# Altium footprint library FS_Footprints.PcbLib: 134 footprints (part 3 of 9)
Each footprint in its own frame and in the unit in brackets; x right, y up, seen from the top. Pads: shape width x height; smd on the part's side, far side on the other; paste and mask are expansions set on the pad; w line width, h text height; cw(c..) or ccw(c..) is an arc to the next point about the centre after c.
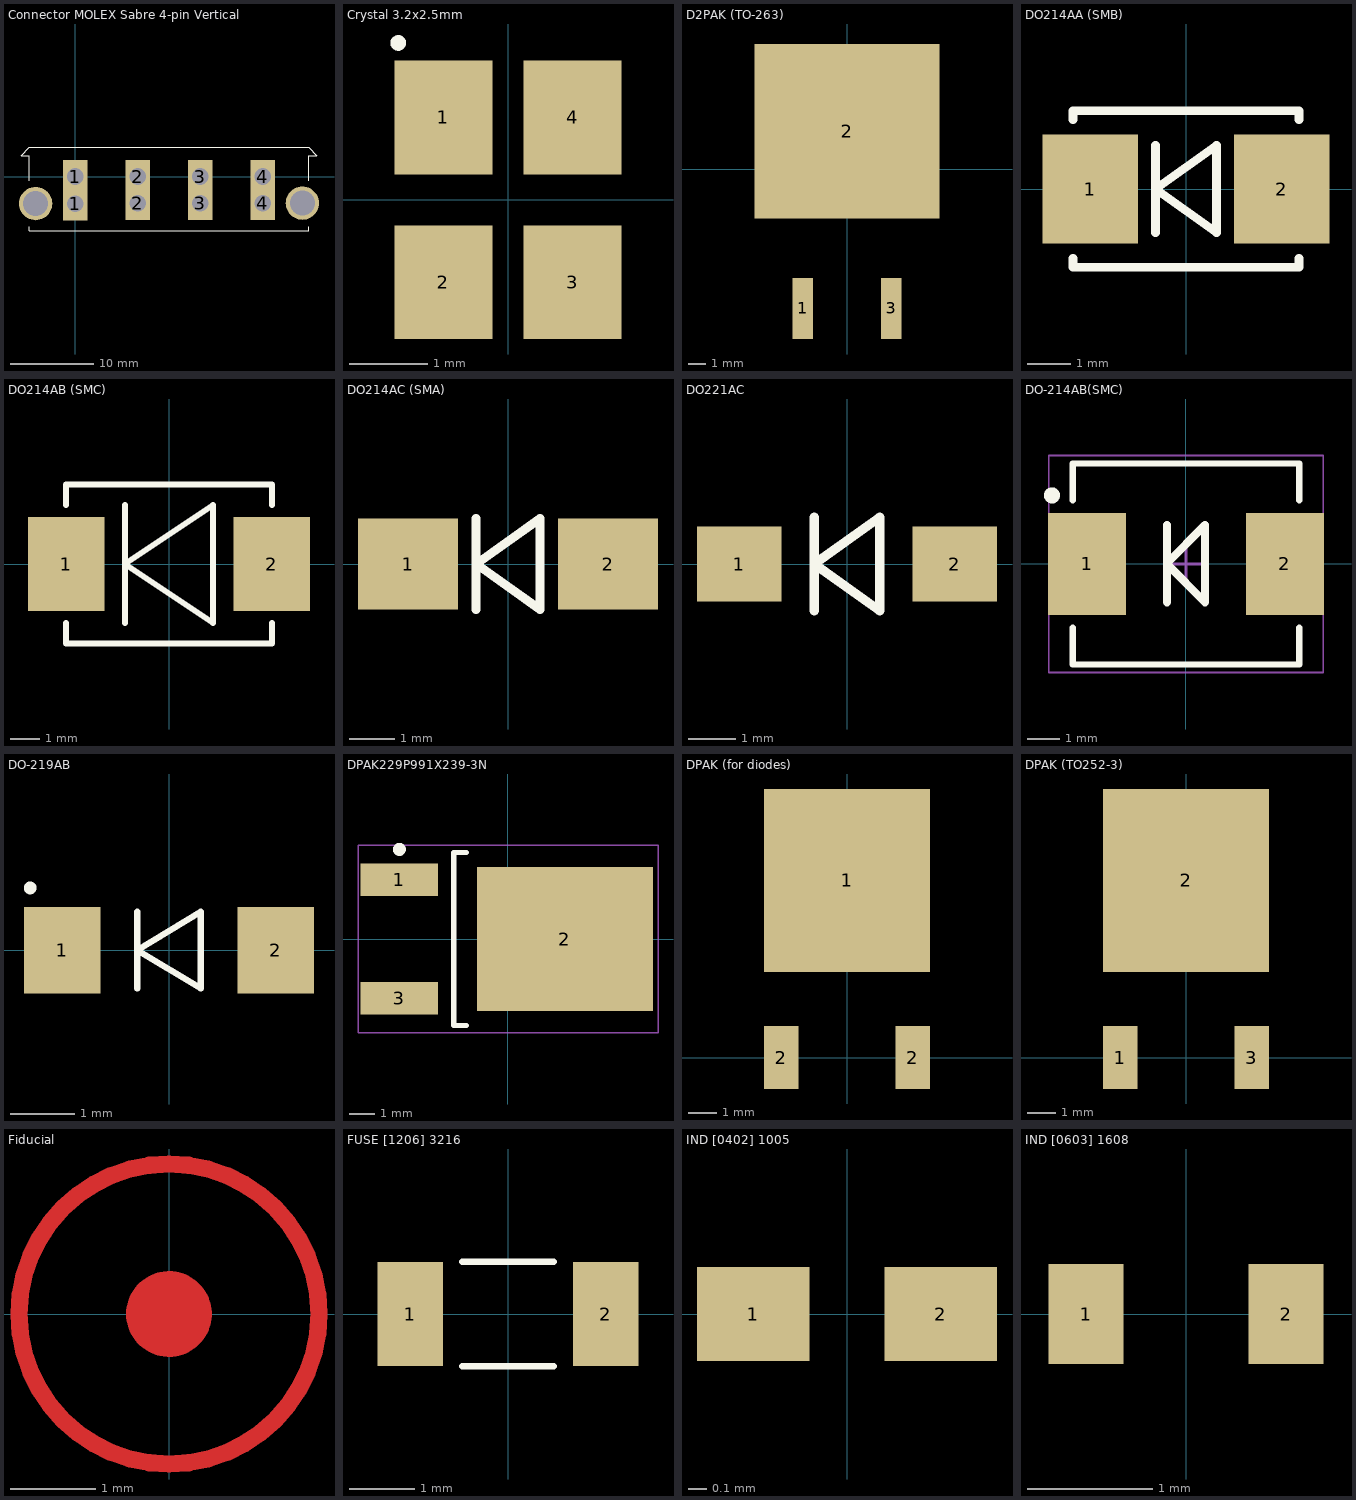
[diagram p2: the footprints below, top view; thin cyan lines are the x and y axes]

## Connector MOLEX Sabre 4-pin Vertical [mm]
pads (10):
  rect 3x4 hole 2: 1(0,-3.25) 1(0,0) 2(7.5,-3.2) 2(7.5,0) 3(15,-3.2) 3(15,0) 4(22.5,-3.2) 4(22.5,0)
  round 4 hole 3: ""(-4.75,-3.25) ""(27.25,-3.2)
Top Overlay:
  lines w0.1: -5.5,-6 -5.5,-6.5 28,-6.5 28,-6 ; -5.5,-0.5 -5.5,2.5 -6.5,2.5 -5.5,3.5 28,3.5 29,2.5 28,2.5 28,-0.5
3D body "431600104.stp": height 14.78, standoff -3.79, extent -6.784,-9.62 29.284,3.766

## Crystal 3.2x2.5mm [mm] "4-Leads, Body 2.50x3.20mm, Pitch 2.10mm, IPC Medium Density"
height 0.45
pads (4):
  rect 1.25x1.45 smd: 1(-0.825,1.05) 2(-0.825,-1.05) 3(0.825,-1.05) 4(0.825,1.05)
Top Overlay:
  circle w0.1: c-1.4,2 r0.05
3D body "User Library-XTAL-3_2x2_5.step": height 0.91, standoff -0.01, extent -1.25,-1.6 1.25,1.6

## D2PAK (TO-263) [mm]
pads (3):
  rect 1.2x3.5 smd: 1(-2.54,-8) 3(2.54,-8)
  rect 10.6x10 smd: 2(0,2.16)
3D body "SW3dPS-TO263-3S.STEP": height 4.78, standoff -0.02, extent -5,-9.561 5,6.109

## DO214AA (SMB) [mm]
pads (2):
  rect 2.2x2.5 smd: 1(-2.2,0) 2(2.2,0)
Top Overlay:
  lines w0.2: -2.6,-1.6 -2.6,-1.8 2.6,-1.8 2.6,-1.6 ; -2.6,1.6 -2.6,1.8 2.6,1.8 2.6,1.6 ; -0.7,-1 -0.7,1 ; -0.7,0 0.7,1 0.7,-1 -0.7,0
3D body "User Library-SMB.step": height 2.45, standoff 0.03, extent -2.75,-1.95 2.75,1.95

## DO214AB (SMC) [mm]
pads (2):
  rect 2.6x3.2 smd: 1(-3.5,0) 2(3.5,0)
Top Overlay:
  lines w0.2: -3.5,-2 -3.5,-2.7 3.5,-2.7 3.5,-2 ; -3.5,2 -3.5,2.7 3.5,2.7 3.5,2 ; -1.5,-2 -1.5,2 ; -1.5,0 1.5,2 1.5,-2 -1.5,0
3D body "User Library-SMC.step": height 2.4, standoff 0.03, extent -4.065,-3.05 4.065,3.05

## DO214AC (SMA) [mm]
pads (2):
  rect 2.2x2 smd: 1(-2.2,0) 2(2.2,0)
Top Overlay:
  lines w0.2: -0.7,-1 -0.7,1 ; -0.7,0 0.7,1 0.7,-1 -0.7,0
3D body "User Library-SMA.step": height 2.6, standoff 0.03, extent -2.75,-1.4 2.75,1.4

## DO221AC [mm]
pads (2):
  rect 1.8x1.6 smd: 1(-2.3,0) 2(2.3,0)
Top Overlay:
  lines w0.2: -0.7,-1 -0.7,1 ; -0.7,0 0.7,1 0.7,-1 -0.7,0
3D body "User Library-DO-221AC.step": height 1.2, standoff 0, extent -2.8,-1.475 2.8,1.475

## DO-214AB(SMC) [mm] "Molded Diode, 2-Leads, Body 6.85x5.90mm, IPC Medium Density"
height 2.6
pads (2):
  rect 2.45x3.2 smd: 1(-3.1,0) 2(3.1,0)
Top Overlay:
  circle w0.25: c-4.2,2.15 r0.125
  lines w0.2: -3.55,-2 -3.55,-3.15 3.55,-3.15 3.55,-2 ; -3.55,2 -3.55,3.15 3.55,3.15 3.55,2
  lines w0.254: -0.6,-1.2 -0.6,1.225 ; -0.6,0 0.6,-1.2 0.6,1.225 -0.6,0.025
Mechanical 15:
  lines w0.05: -4.3,-3.4 4.3,-3.4 4.3,3.4 -4.3,3.4 -4.3,-3.4
  lines w0.1: -0.5,0 0.5,0 ; 0,-0.5 0,0.5
3D body "DO-214AB(SMC).step": height 2.6, standoff 0, extent -3.77,-3.1 3.77,3.1

## DO-219AB [mm] "SODFL, 2-Leads, Body 1.90x4.00mm, IPC Medium Density"
height 1.1
pads (2):
  rect 1.2x1.35 smd: 1(-1.675,0) 2(1.675,0)
Top Overlay:
  circle w0.1: c-2.175,0.975 r0.05
  lines w0.1: -0.5,-0.6 -0.5,0.6 ; -0.5,0 0.5,-0.6 0.5,0.6 -0.5,0
3D body "User Library-DO-219AB SMF.step": height 1.25, standoff 0, extent -1.95,-0.95 1.95,0.95

## DPAK229P991X239-3N [mm] "D-PAK, 3-Pads, Body 6,21x6,73mm (max), IPC Medium Density"
height 2.39
pads (3):
  rect 3x1.25 smd: 1(-4.2,2.29) 3(-4.2,-2.29)
  rect 6.8x5.55 smd: 2(2.2,0)
Top Overlay:
  circle w0.25: c-4.2,3.465 r0.125
  lines w0.2: -1.6,-3.35 -2.1,-3.35 -2.1,3.35 -1.6,3.35
Mechanical 15:
  lines w0.05: -5.8,-3.625 5.8,-3.625 5.8,3.625 -5.8,3.625 -5.8,-3.625
  lines w0.1: -0.5,0 0.5,0 ; 0,-0.5 0,0.5
3D body "DPAK229P991X239-3N.step": height 2.39, standoff 0, extent -5.08,-3.375 4.825,3.375

## DPAK (for diodes) [mm] "2-pin version, pin 1 = K, pin 2 = A"
pads (3):
  rect 5.8x6.4 smd: 1(0,6.2)
  rect 1.2x2.2 smd: 2(-2.3,0) 2(2.3,0)
3D body "User Library-TO252AA.step": height 2.3, standoff -0.01, extent -3.29,-0.7 3.29,9

## DPAK (TO252-3) [mm]
pads (3):
  rect 1.2x2.2 smd: 1(-2.3,0) 3(2.3,0)
  rect 5.8x6.4 smd: 2(0,6.2)
3D body "User Library-TO252AA.step": height 2.3, standoff -0.01, extent -3.29,-0.7 3.29,9

## Fiducial [mm]
Top Layer:
  circle w0.5: c0,0 r0.25
  circle w0.2: c0,0 r1.75

## FUSE [1206] 3216 [mm]
pads (2):
  rect 1x1.6 smd: 1(-1.5,0) 2(1.5,0)
Top Overlay:
  lines w0.1: -0.7,-0.8 0.7,-0.8 ; -0.7,0.8 0.7,0.8
3D body "User Library-nona SMD075F.step": height 0.56, standoff 0, extent -1.601,-0.826 1.601,0.826

## IND [0402] 1005 [mm]
pads (2):
  rect 0.6x0.5 smd: 1(-0.5,0) 2(0.5,0)
3D body "Coilcraft-0402AF.step": height 0.65, standoff -0.01, extent -0.56,-0.256 0.56,0.256

## IND [0603] 1608 [mm]
pads (2):
  rect 0.6x0.8 smd: 1(-0.8,0) 2(0.8,0)
3D body "Coilcraft-0603CT.step": height 0.52, standoff -0.01, extent -0.772,-0.381 0.772,0.381